# Altium footprint library SENSOR.PcbLib: 56 footprints (part 4 of 4)
Each footprint in its own frame and in the unit in brackets; x right, y up, seen from the top. Pads: shape width x height; smd on the part's side, far side on the other; paste and mask are expansions set on the pad; w line width, h text height; cw(c..) or ccw(c..) is an arc to the next point about the centre after c.
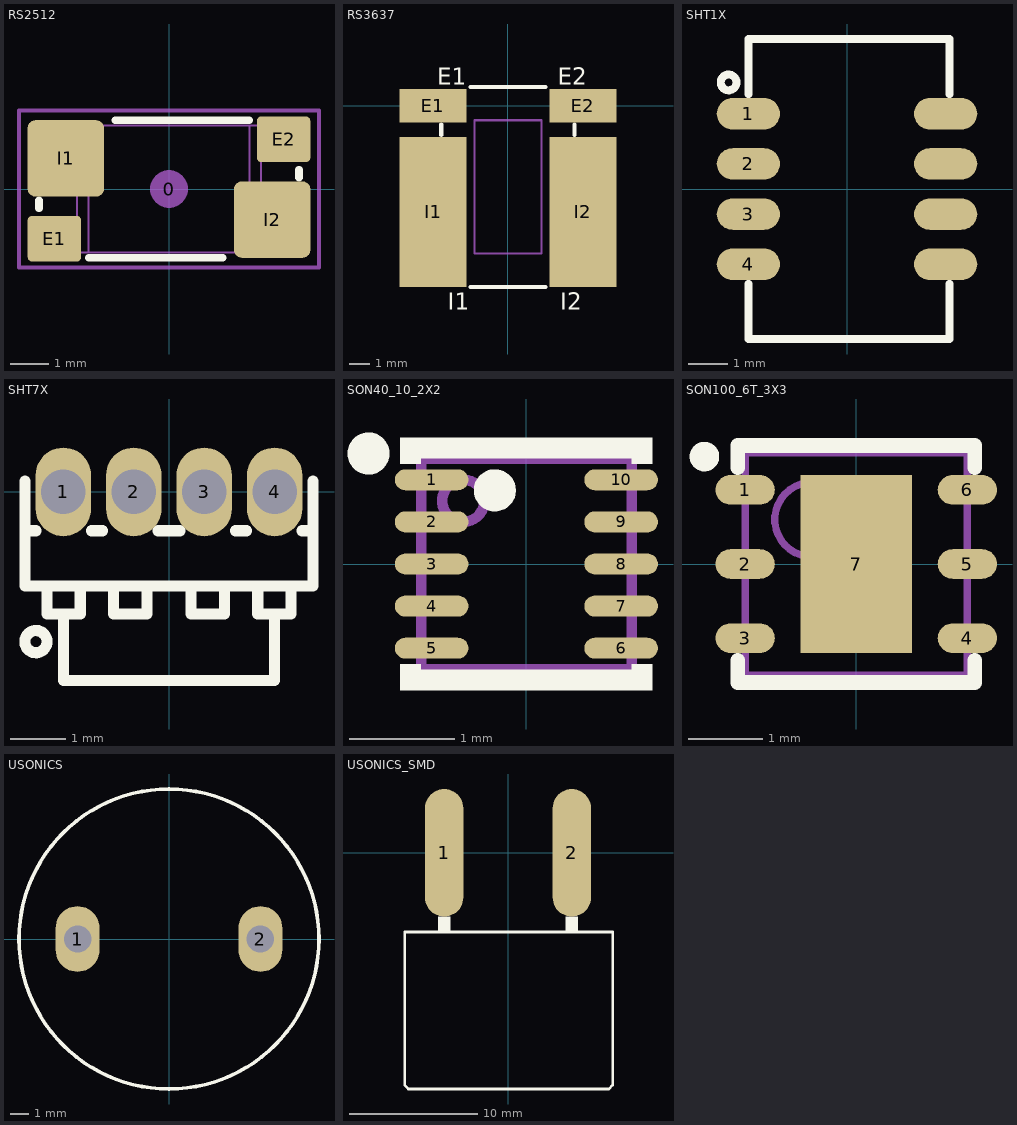
[diagram p3: the footprints below, top view; thin cyan lines are the x and y axes]

## RS2512 [mm] "RESISTOR SHUNT SMD, 6.3x3.2mm, 2512"
height 0.89
pads (5):
  round 1 on Mech15: 0(0,0)
  rrect20% 1.4x1.2 smd paste-0.7: E1(-3,-1.3) E2(3,1.3)
  rrect20% 2x2 smd paste-1.1: I1(-2.7,0.8) I2(2.7,-0.8)
Top Overlay:
  lines w0.2: -3.4,-0.5 -3.4,-0.3 ; -2.1,-1.8 1.4,-1.8 ; -1.4,1.8 2.1,1.8 ; 3.4,0.3 3.4,0.5
Mechanical 13:
  circle w0.05: c0,0 r0.25
  lines w0.05: -2.106,-1.663 -2.106,1.663 ; 2.106,-1.663 2.106,1.663 ; -3.3,-1.663 -3.3,-0.813 -2.406,-0.813 -2.406,0.038 -3.3,0.038 -3.3,1.663 3.3,1.663 3.3,0.813 2.406,0.813 2.406,-0.038 3.3,-0.038 3.3,-1.663 -3.3,-1.663
Mechanical 15:
  lines w0.1: -3.925,-2.05 -3.925,2.05 3.925,2.05 3.925,-2.05 -3.925,-2.05
3D body "RESC6332X89_119T_KELVIN.STEP": height 0.88, standoff 0, extent -3.3,-1.662 3.3,1.663

## RS3637 [mm] "RESISTOR SHUNT SMD, 9.1X9.4mm, 3637, LVK25R005FER"
pads (4):
  rect 3.2x1.6 smd: E1(-3.6,0) E2(3.6,0)
  rect 3.2x7.2 smd: I1(-3.6,-5.1) I2(3.6,-5.1)
Top Overlay:
  lines w0.2: -3.2,-1.4 -3.2,-0.9 ; -1.8,-8.7 1.8,-8.7 ; -1.8,0.9 1.8,0.9 ; 3.2,-1.4 3.2,-0.9
  text "E1" at -3.4,1 h0.8
  text "I1" at -2.9,-9.8 h0.8
  text "E2" at 2.4,1 h0.8
  text "I2" at 2.5,-9.8 h0.8
Mechanical 13:
  lines w0.1: -1.6,-7.1 1.6,-7.1 1.6,-0.7 -1.6,-0.7 -1.6,-7.1
3D body "User Library-WSL3637.step": height 0.64, standoff 0, extent -4.57,-8.6 4.57,0.8

## SHT1X [mm]
pads (8):
  oval 1.6x0.8 smd paste-0.05 mask+0.075: 1(-2.5,1.905) 2(-2.5,0.635) 3(-2.5,-0.635) 4(-2.5,-1.905) ""(2.5,-1.905) ""(2.5,-0.635) ""(2.5,0.635) ""(2.5,1.905)
Top Overlay:
  circle w0.2: c-3,2.7 r0.2
  lines w0.2: -2.5,-2.4 -2.5,-3.8 2.6,-3.8 2.6,-2.4 ; -2.5,2.4 -2.5,3.8 2.6,3.8 2.6,2.4
3D body "SHT1x.STEP": height 2.35, standoff -0.01, extent -2.43,-3.735 2.5,3.735

## SHT7X [mm]
pads (4):
  oval 1x1.6 hole 0.8 mask+0.075: 1(-1.905,0) 2(-0.635,0)
  oval 1x1.6 hole 0.8 paste+0 mask+0.075: 3(0.635,0) 4(1.905,0)
Top Overlay:
  circle w0.2: c-2.4,-2.7 r0.2
  lines w0.2: -2.6,-0.7 -2.4,-0.7 ; -2.6,0.2 -2.6,-1.7 2.6,-1.7 2.6,0.2 ; -2.2,-1.7 -2.2,-2.2 -1.6,-2.2 -1.6,-1.7 ; -1.9,-2.2 -1.9,-3.4 1.9,-3.4 1.9,-2.2 ; -1.4,-0.7 -1.2,-0.7 ; -1,-1.7 -1,-2.2 -0.4,-2.2 -0.4,-1.7 ; -0.2,-0.7 0.2,-0.7 ; 0.4,-1.7 0.4,-2.2 1,-2.2 1,-1.7 ; 1.2,-0.7 1.4,-0.7 ; 1.6,-1.7 1.6,-2.2 2.2,-2.2 2.2,-1.7 ; 2.4,-0.7 2.6,-0.7
3D body "SHT7x.STEP": height 13.7, standoff -6.1, extent -2.54,-3.3 2.54,0.1

## SON40_10_2X2 [mm] "DFN-10 pitch:2mm 2X2X0.85mm"
height 0.9
pads (10):
  oval 0.7x0.2 smd mask+0.05: 1(-0.9,0.8) 2(-0.9,0.4) 3(-0.9,0) 4(-0.9,-0.4) 5(-0.9,-0.8) 6(0.9,-0.8) 7(0.9,-0.4) 8(0.9,0) 9(0.9,0.4) 10(0.9,0.8)
Top Overlay:
  circle w0.2: c-1.5,1.05 r0.1
  circle w0.2: c-0.3,0.7 r0.1
  region: 1.2,-0.95 1,-0.95 1,-1.2 1.2,-1.2
  rectangle: -1.2,-1.2 -1,-0.95
  rectangle: -1.2,0.95 -1,1.2
  region: 1.2,1.2 1,1.2 1,0.95 1.2,0.95
  lines w0.2: -1.1,-1.1 1.1,-1.1 ; -1.1,1.1 1.1,1.1
Mechanical 13:
  circle w0.1: c-0.6,0.6 r0.2
  lines w0.1: -1,-1 -1,1 1,1 1,-1 -1,-1
3D body "User Library-DFN-10 (2x2) 0_4 pitch.step": height 0.85, standoff -0.03, extent -1.01,-1 1.01,1

## SON100_6T_3X3 [mm] "SON, 6-Leads, Body 3x3mm, Pitch 1.00mm, STS21"
height 1.1
pads (7):
  oval 0.8x0.4 smd mask+0.075: 1(-1.5,1) 2(-1.5,0) 3(-1.5,-1) 4(1.5,-1) 5(1.5,0) 6(1.5,1)
  rect 1.5x2.4 smd paste-5: 7(0,0)
Top Overlay:
  circle w0.2: c-2.05,1.45 r0.1
  lines w0.2: -1.6,-1.3 -1.6,-1.6 1.6,-1.6 1.6,-1.3 ; -1.6,1.3 -1.6,1.6 1.6,1.6 1.6,1.3
Top Paste:
  rectangle: -0.6,-1 0.6,-0.2
  rectangle: -0.6,0.2 0.6,1
Mechanical 13:
  circle w0.1: c-0.6,0.6 r0.5
  lines w0.1: -1.5,-1.5 1.5,-1.5 1.5,1.5 -1.5,1.5 -1.5,-1.5
3D body "Sensirion_Humidity_SHT2x-STEP-file.STEP": height 1.1, standoff 0, extent -1.5,-1.5 1.5,1.5

## USONICS [mm] "ULTRASONIC 400PT160"
height 1.27
pads (2):
  oval 2.4x3.6 hole 1.5: 1(-5,0) 2(5,0)
Top Overlay:
  circle w0.2: c0,0 r8.2
3D body "User Library-400PT160.STEP": height 12.1, standoff -9.9, extent -8.1,-8.1 8.1,8.1

## USONICS_SMD [mm] "ULTRASONIC 400PT160"
height 1.27
pads (2):
  oval 3x10 smd: 1(-5,0) 2(5,0)
Top Overlay:
  rectangle: -5.5,-6.2 -4.5,-5
  rectangle: 4.5,-6.2 5.5,-5
  lines w0.2: -8.1,-18.2 -8.1,-6.2 8.2,-6.2 8.2,-18.2 7.9,-18.5 -7.8,-18.5 -8.1,-18.2
3D body "User Library-400PT160.STEP": height 8.6, standoff -7.6, extent -8.05,-18.4 8.15,3.6